# Altium footprint library my Library.PcbLib: 1247 footprints (part 8 of 78)
Each footprint in its own frame and in the unit in brackets; x right, y up, seen from the top. Pads: shape width x height; smd on the part's side, far side on the other; paste and mask are expansions set on the pad; w line width, h text height; cw(c..) or ccw(c..) is an arc to the next point about the centre after c.
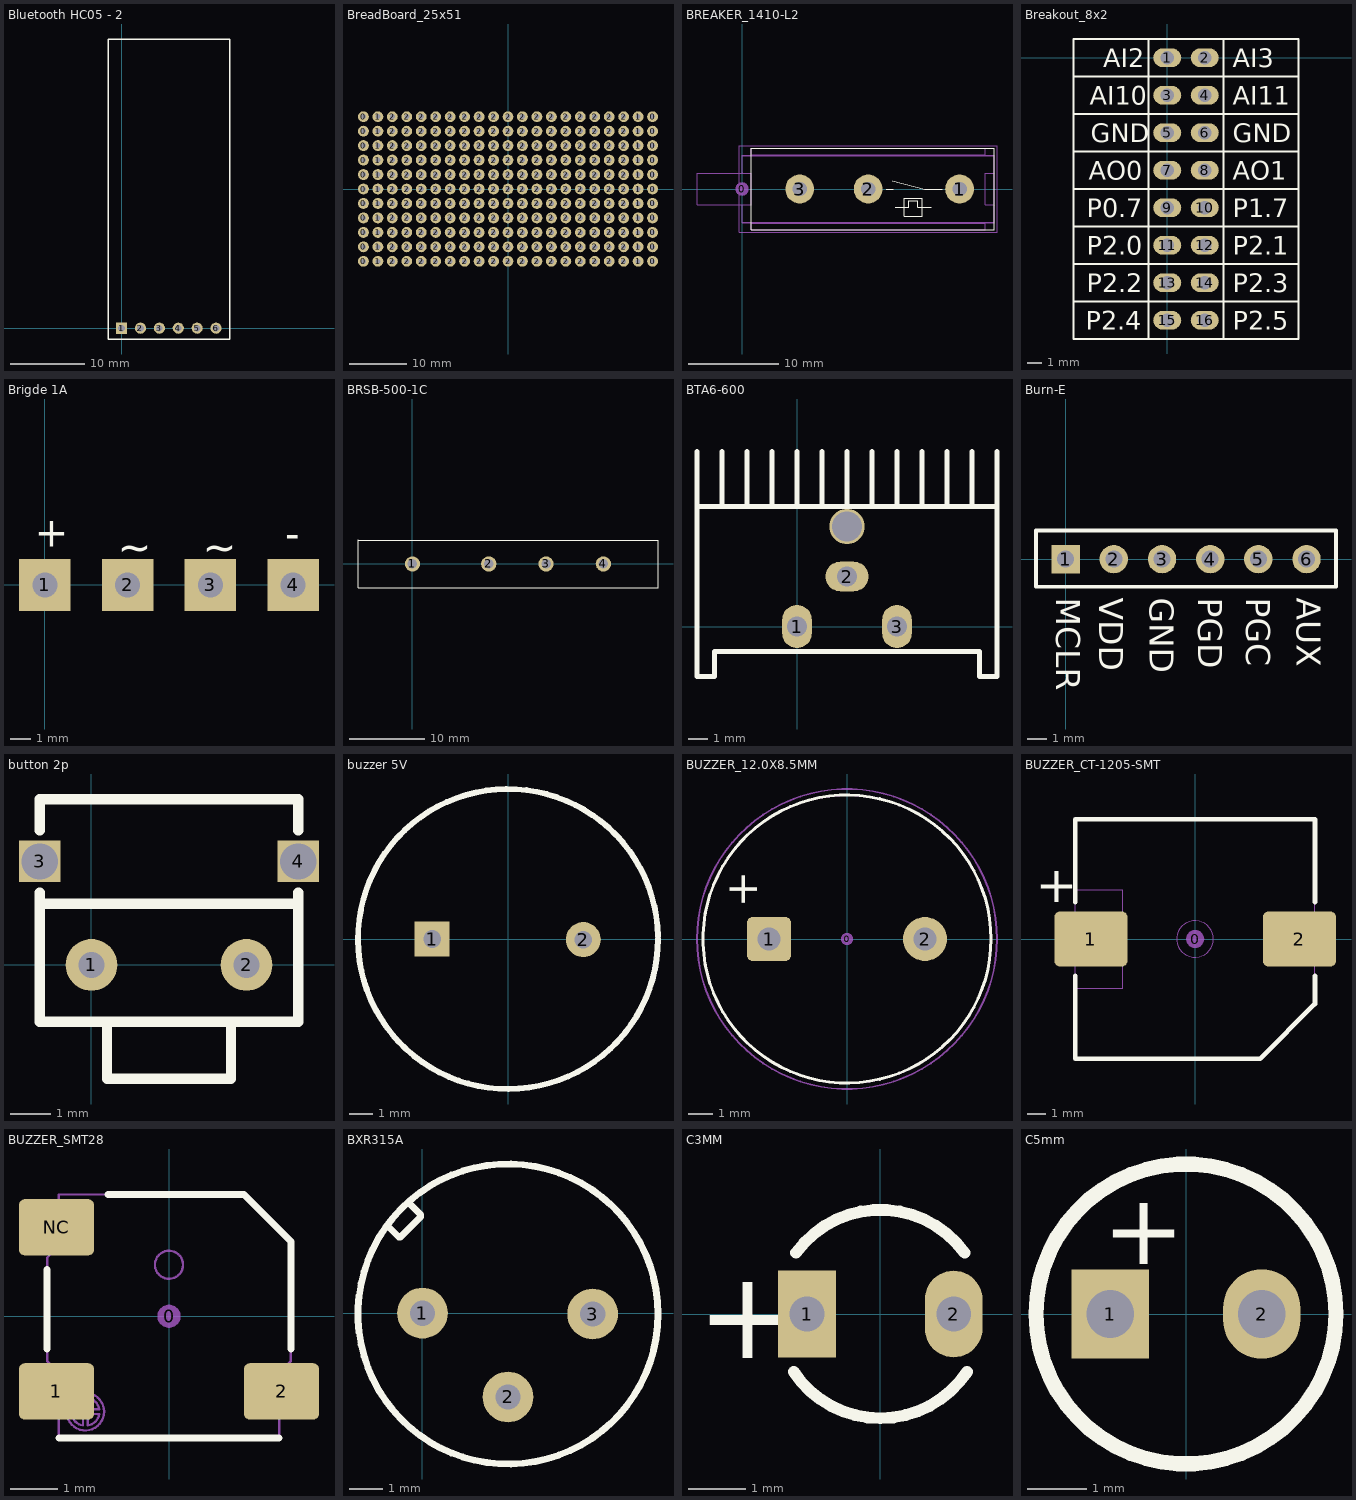
[diagram p7: the footprints below, top view; thin cyan lines are the x and y axes]

## Bluetooth HC05 - 2 [mm] "Connector; Header; 6 Position"
height 1.14
pads (6):
  rect 1.5x1.5 hole 0.9: 1(0,0)
  round 1.5 hole 0.9: 2(2.54,0) 3(5.08,0) 4(7.62,0) 5(10.16,0) 6(12.7,0)
Top Overlay:
  lines w0.2: -1.763,-1.455 -1.763,38.862 14.511,38.862 14.511,-1.455 -1.763,-1.455
3D body "User Library-blue.STEP": height 4.05, standoff -0.75, extent -1.522,-0.635 14.478,38.784

## BreadBoard_25x51 [mil] "Small 1\"x2\" breadboard section"
pads (231):
  round 75 hole 35: 0(-1000,-500) 0(-1000,-400) 0(-1000,-300) 0(-1000,-200) 0(-1000,-100) 0(-1000,0) 0(-1000,100) 0(-1000,200) 0(-1000,300) 0(-1000,400) 0(-1000,500) 0(1000,-500) 0(1000,-400) 0(1000,-300) 0(1000,-200) 0(1000,-100) 0(1000,0) 0(1000,100) 0(1000,200) 0(1000,300) 0(1000,400) 0(1000,500) 1(-900,-500) 1(-900,-400) 1(-900,-300) 1(-900,-200) 1(-900,-100) 1(-900,0) 1(-900,100) 1(-900,200) 1(-900,300) 1(-900,400) 1(-900,500) 1(900,-500) 1(900,-400) 1(900,-300) 1(900,-200) 1(900,-100) 1(900,0) 1(900,100) 1(900,200) 1(900,300) 1(900,400) 1(900,500) 2(-800,-500) 2(-800,-400) 2(-800,-300) 2(-800,-200) 2(-800,-100) 2(-800,0) 2(-800,100) 2(-800,200) 2(-800,300) 2(-800,400) 2(-800,500) 2(-700,-500) 2(-700,-400) 2(-700,-300) 2(-700,-200) 2(-700,-100) 2(-700,0) 2(-700,100) 2(-700,200) 2(-700,300) 2(-700,400) 2(-700,500) 2(-600,-500) 2(-600,-400) 2(-600,-300) 2(-600,-200) 2(-600,-100) 2(-600,0) 2(-600,100) 2(-600,200) 2(-600,300) 2(-600,400) 2(-600,500) 2(-500,-500) 2(-500,-400) 2(-500,-300) 2(-500,-200) 2(-500,-100) 2(-500,0) 2(-500,100) 2(-500,200) 2(-500,300) 2(-500,400) 2(-500,500) 2(-400,-500) 2(-400,-400) 2(-400,-300) 2(-400,-200) 2(-400,-100) 2(-400,0) 2(-400,100) 2(-400,200) 2(-400,300) 2(-400,400) 2(-400,500) 2(-300,-500) 2(-300,-400) 2(-300,-300) 2(-300,-200) 2(-300,-100) 2(-300,0) 2(-300,100) 2(-300,200) 2(-300,300) 2(-300,400) 2(-300,500) 2(-200,-500) 2(-200,-400) 2(-200,-300) 2(-200,-200) 2(-200,-100) 2(-200,0) 2(-200,100) 2(-200,200) 2(-200,300) 2(-200,400) 2(-200,500) 2(-100,-500) 2(-100,-400) 2(-100,-300) 2(-100,-200) 2(-100,-100) 2(-100,0) 2(-100,100) 2(-100,200) 2(-100,300) 2(-100,400) 2(-100,500) 2(0,-500) 2(0,-400) 2(0,-300) 2(0,-200) 2(0,-100) 2(0,0) 2(0,100) 2(0,200) 2(0,300) 2(0,400) 2(0,500) 2(100,-500) 2(100,-400) 2(100,-300) 2(100,-200) 2(100,-100) 2(100,0) 2(100,100) 2(100,200) 2(100,300) 2(100,400) 2(100,500) 2(200,-500) 2(200,-400) 2(200,-300) 2(200,-200) 2(200,-100) 2(200,0) 2(200,100) 2(200,200) 2(200,300) 2(200,400) 2(200,500) 2(300,-500) 2(300,-400) 2(300,-300) 2(300,-200) 2(300,-100) 2(300,0) 2(300,100) 2(300,200) 2(300,300) 2(300,400) 2(300,500) 2(400,-500) 2(400,-400) 2(400,-300) 2(400,-200) 2(400,-100) 2(400,0) 2(400,100) 2(400,200) 2(400,300) 2(400,400) 2(400,500) 2(500,-500) 2(500,-400) 2(500,-300) 2(500,-200) 2(500,-100) 2(500,0) 2(500,100) 2(500,200) 2(500,300) 2(500,400) 2(500,500) 2(600,-500) 2(600,-400) 2(600,-300) 2(600,-200) 2(600,-100) 2(600,0) 2(600,100) 2(600,200) 2(600,300) 2(600,400) 2(600,500) 2(700,-500) 2(700,-400) 2(700,-300) 2(700,-200) 2(700,-100) 2(700,0) 2(700,100) 2(700,200) 2(700,300) 2(700,400) 2(700,500) 2(800,-500) 2(800,-400) 2(800,-300) 2(800,-200) 2(800,-100) 2(800,0) 2(800,100) 2(800,200) 2(800,300) 2(800,400) 2(800,500)

## BREAKER_1410-L2 [mm] "E-T-A Thermal Overcurrent Circuit Breaker 1410-L2"
height 10.8
pads (4):
  round 1.5 on Mech15: 0(0,0)
  round 3.2 hole 1.6: 1(24.15,0) 2(14,0) 3(6.4,0)
Top Overlay:
  lines w0.127: 16,0 16.8,0 ; 16.7,0.9 20.3,0 22.2,0 ; 17,-2 18.5,-2 18.5,-1.3 19.5,-1.3 19.5,-2 21,-2 ; 1,-4.5 1,4.5 28,4.5 28,-4.5 1,-4.5 ; 18,-3 18,-1 20,-1 20,-3 18,-3
Mechanical 13:
  lines w0.05: 0,-3.7 28,-3.7 ; 0,-1.8 0.05,-1.75 ; 0,-1.75 0,-3.75 28,-3.75 28,3.75 0,3.75 0,1.75 ; 0,1.8 0.05,1.75 ; 0,3.7 28,3.7 ; 1,-3.8 27,-3.8 ; 1,-3.75 1,-4.5 27,-4.5 27,-3.75 ; 1,3.75 1,4.5 27,4.5 27,3.75 ; 1,3.8 27,3.8 ; 28,-1.8 27.95,-1.75 ; 28,-1.7 27.95,-1.75 ; 28,1.7 27.95,1.75 ; 28,1.8 27.95,1.75 ; 27.95,-1.75 27,-1.75 27,1.75 27.95,1.75 ; -5,-1.75 -5,1.75 1,1.75 1,-1.75 -5,-1.75
Mechanical 15:
  lines w0.127: -0.3,-4.8 28.3,-4.8 28.3,4.8 -0.3,4.8 -0.3,-4.8
3D body "Circuit Breaker 1410-L2.STEP": height 10.8, standoff -3.3, extent -5,-4.5 28,4.5

## Breakout_8x2 [mil] "Small DAQ breakout for hookup to breadboard section"
pads (16):
  oval 75x50 hole 35: 1(0,0) 2(100,0) 3(0,-100) 4(100,-100) 5(0,-200) 6(100,-200) 7(0,-300) 8(100,-300) 9(0,-400) 10(100,-400) 11(0,-500) 12(100,-500) 13(0,-600) 14(100,-600) 15(0,-700) 16(100,-700)
Top Overlay:
  lines w5: -250,-650 350,-650 ; -250,-550 350,-550 ; -250,-450 350,-450 ; -250,-350 350,-350 ; -250,-250 350,-250 ; -250,-150 350,-150 ; -250,-50 350,-50 ; -50,-750 -50,50 ; -50,-750 150,-750 ; -50,-750 -250,-750 -250,50 -50,50 ; -50,50 150,50 ; 150,-750 150,50 ; 150,-750 350,-750 350,50 150,50
  text "AI3" at 175,-25 h50
  text "AI11" at 175,-125 h50
  text "P2.0" at -215,-525 h50
  text "P2.2" at -215,-625 h50
  text "P2.4" at -217.38,-725 h50
  text "P2.1" at 175,-525 h50
  text "P2.3" at 175,-625 h50
  text "P2.5" at 175,-725 h50
  text "P1.7" at 175,-425 h50
  text "P0.7" at -215,-425 h50
  text "AO1" at 175,-325 h50
  text "AO0" at -209.76,-325 h50
  text "AI10" at -207.14,-125 h50
  text "AI2" at -170.49,-25 h50
  text "GND" at -204.53,-225 h50
  text "GND" at 175,-225 h50

## Brigde 1A [mm]
pads (4):
  rect 2.5x2.5 / inner round 1.575 / far side rect 2.5x2.5 hole 1.2: 1(0,0) 2(4,0) 3(8,0) 4(12,0)
Top Overlay:
  text "-" at 11.608,1.778 h1.43
  text "+" at -0.483,1.841 h1.43
  text "~" at 7.62,1.13 h1.43
  text "~" at 3.531,1.118 h1.43
3D body "User Library-DiodeBridge.step": height 9.5, standoff -14.7, extent -1.321,-2.343 13.259,2.667

## BRSB-500-1C [mil] "bridge 5A"
pads (4):
  round 80 hole 50: 1(0,0) 2(400,0) 3(700,0) 4(1000,0)
Top Overlay:
  lines w5: -285,125.5 -285,-125.5 1285,-125.5 ; -284,124.5 1286,124.5 1286,-126.5

## BTA6-600 [mm] "TRIAC BTA6/6A/600V"
pads (4):
  oval 1.5x2.2 hole 1: 1(0,0) 3(5.08,0)
  oval 2.2x1.5 hole 1: 2(2.54,2.54)
  round 1.8 hole 1.5: ""(2.54,5.08)
Top Overlay:
  lines w0.254: -5.08,6.096 10.16,6.096 ; -5.08,8.89 -5.08,-2.54 -4.191,-2.54 -4.191,-1.27 9.271,-1.27 9.271,-2.54 10.16,-2.54 10.16,8.89 ; -3.81,6.096 -3.81,8.89 ; -2.54,6.096 -2.54,8.89 ; -1.27,6.096 -1.27,8.89 ; 0,6.096 0,8.89 ; 1.27,6.096 1.27,8.89 ; 2.54,6.096 2.54,8.89 ; 3.81,6.096 3.81,8.89 ; 5.08,6.096 5.08,8.89 ; 6.35,6.096 6.35,8.89 ; 7.62,6.096 7.62,8.89 ; 8.89,6.096 8.89,8.89
3D body "User Library-Disipador TO.step": height 20, standoff 0, extent -5.96,2.54 11.04,12.54
3D body "User Library-TO-220-3.step": height 18.7, standoff -10.08, extent -2.41,-2.083 7.49,2.417

## Burn-E [mm] "Connector; Header; 6 Position"
height 1.14
pads (6):
  rect 1.5x1.5 hole 0.9: 1(0,0)
  round 1.5 hole 0.9: 2(2.54,0) 3(5.08,0) 4(7.62,0) 5(10.16,0) 6(12.7,0)
Top Overlay:
  lines w0.2: -1.565,-1.455 14.254,-1.455 14.254,1.516 -1.565,1.516 -1.565,-1.455
  text "MCLR" at -0.508,-2.032 h1.27
  text "VDD" at 1.778,-2.032 h1.27
  text "GND" at 4.445,-2.032 h1.27
  text "PGD" at 6.985,-2.032 h1.27
  text "PGC" at 9.525,-2.032 h1.27
  text "AUX" at 12.192,-2.032 h1.27
3D body "female_header_a-bl254-eg-g06d.stp": height 7.92, standoff -3.78, extent -1.395,-1.237 14.095,1.263

## button 2p [mil]
pads (4):
  round 50 hole 25: 1(0,0) 2(150,0)
  rect 40x40 hole 35 square: 3(-50,100) 4(200,100)
Top Overlay:
  lines w10: -50,59 200,59 200,60 ; -50,70 -50,-55 200,-55 200,70 ; -50,130 -50,160 200,160 200,130 ; 15,-55 15,-110 135,-110 135,-55

## buzzer 5V [mil]
height 2
pads (2):
  rect 60x60 hole 30: 1(-130,0)
  round 60 hole 30: 2(129,-1)
Top Overlay:
  lines w10: 256.97,4 ccw(c0,0) 257,0
3D body "cem-1201s.stp": height 345.09, standoff -245.46, extent -236.23,-236.22 236.21,236.22

## BUZZER_12.0X8.5MM [mil]
height 354.33
pads (3):
  round 20 on Mech15: 0(0,0)
  rrect25% 72x72 / inner rrect25% 72x72 / far side rrect25% 90x90 hole 38: 1(-127.95,0)
  round 72 / inner round 72 / far side round 90 hole 38: 2(127.95,0)
Top Overlay:
  circle w5: c0,0 r236.22
  text "+" at -129.92,51.18 h90
Mechanical 13:
  circle w3: c0.14,-0.47 r236.22
Mechanical 15:
  circle w3: c0,0 r246.06
3D body "3100-xxx speaker 8.5mm.STEP": height 354.33, standoff -110.24, extent -246.02,-246.04 246.07,246.06
3D body "TH pad - 28 pin x 90.STEP": height 50, standoff 0, extent 83.31,-44.9 172.96,44.92
3D body "TH pad - 28 pin x 90.STEP": height 50, standoff 0, extent -172.59,-44.91 -82.95,44.92

## BUZZER_CT-1205-SMT [mm] "Buzzer SMD sealed 12.8 L x 12.8 W x 7.6mm H 5Vp"
height 7.6
pads (3):
  round 1 on Mech15: 0(0,0)
  rrect20% 4x3 smd: 1(-5.7,0) 2(5.7,0)
Top Overlay:
  lines w0.254: -6.55,-2 -6.55,-6.55 3.55,-6.55 6.55,-3.55 6.55,-2 ; -6.55,2 -6.55,6.55 6.55,6.55 6.55,2
  text "+" at -8.7,2 h2
Mechanical 13:
  circle w0.05: c0,0 r1
  lines w0.05: -6.65,-1.15 -6.65,1.15 ; -6.55,-2.7 -3.95,-2.7 -3.95,2.7 -6.55,2.7 ; -6.55,-1.15 -7.15,-1.15 -7.15,1.15 -6.55,1.15 ; 6.55,-1.15 7.15,-1.15 7.15,1.15 6.55,1.15 ; 6.65,-1.15 6.65,1.15 ; -6.55,-6.55 -6.55,6.55 6.55,6.55 6.55,-3.55 3.55,-6.55 -6.55,-6.55
3D body "CT-1205-SMT.STEP": height 7.6, standoff 0, extent -7.15,-6.55 7.15,6.55

## BUZZER_SMT28 [mm] "Buzzer SMD sealed 5.0 L x 5.0 W x 2.0mm H 5Vp"
height 2.2
pads (4):
  round 0.5 on Mech15: 0(0,0)
  rrect20% 1.6x1.2 smd: 1(-2.4,-1.6) 2(2.4,-1.6) NC(-2.4,1.9)
Top Overlay:
  lines w0.15: -2.6,-0.7 -2.6,1 ; -2.35,-2.6 2.35,-2.6 ; -1.3,2.6 1.6,2.6 2.6,1.6 2.6,-0.7
Mechanical 13:
  circle w0.05: c0,1.1 r0.3
  circle w0.05: c-1.784,-2.034 r0.4
  lines w0.05: -2.65,-1.95 -2.65,-1.25 ; -2.65,1.55 -2.65,2.25 ; -2.35,-1.95 -2.75,-1.95 -2.75,-1.25 -2.35,-1.25 ; -2.35,1.55 -2.75,1.55 -2.75,2.25 -2.35,2.25 ; 2.35,-1.95 2.75,-1.95 2.75,-1.25 2.35,-1.25 ; 2.65,-1.95 2.65,-1.25 ; -2.6,-0.95 -2.6,1.25 -2.35,1.5 -2.35,2.6 1.6,2.6 2.6,1.6 2.6,-0.95 2.35,-1.2 2.35,-2.6 -2.35,-2.6 -2.35,-1.2 -2.6,-0.95 ; -2.08,-2.084 ccw(c-1.784,-2.034) -1.834,-2.33 -1.834,-2.084 -2.08,-2.084 ; -2.08,-1.984 cw(c-1.784,-2.034) -1.834,-1.739 -1.834,-1.984 -2.08,-1.984 ; -1.734,-2.33 ccw(c-1.784,-2.034) -1.489,-2.084 -1.734,-2.084 -1.734,-2.33 ; -1.734,-1.984 -1.489,-1.984 ccw(c-1.784,-2.034) -1.734,-1.739 -1.734,-1.984
3D body "Buzzer SMT28 series.STEP": height 2, standoff 0, extent -2.75,-2.6 2.75,2.6

## BXR315A [mil] "Xtal for RF"
pads (3):
  round 60 hole 30: 1(0,0) 2(101,-99) 3(201,-1)
Top Overlay:
  circle w8: c101,-1 r177.17
  lines w8: -41,103 -28,90 -26,90 -2,114 -2,116 -15,129
3D body "SW3dPS-fds100 photo diode (thorlabs, inc).STEP": height 140, standoff -1500, extent -81,-186 279,174

## C3MM [mm]
pads (2):
  rect 1x1.5 hole 0.6: 1(-1.27,0)
  oval 1x1.5 hole 0.6: 2(1.27,0)
Top Overlay:
  lines w0.203: -1.502,-1.001 ccw(c0,0) 1.502,-1.001 ; -1.46,1.062 cw(c0,0) 1.46,1.062
  text "+" at -3.175,-0.762 h1.52
3D body "User Library-Capacitor Radial Electrolitic-150-400x700.step": height 7.01, standoff -2.7, extent -2,-2.025 1.993,1.975

## C5mm [mm]
pads (2):
  rect 1.3x1.5 hole 0.8: 1(-1.27,0)
  oval 1.3x1.5 hole 0.8: 2(1.27,0)
Top Overlay:
  circle w0.254: c0,0 r2.515
  text "+" at -1.397,0.838 h1.2
3D body "User Library-Capacitor Radial Electrolitic 200 - 500x1100.step": height 11.01, standoff -2.7, extent -2.5,-2.5 2.489,2.5